# Altium schematic symbol library JL_SCH.SchLib: 1185 symbols (part 1 of 6)
Pins are listed as number, name and electrical type; pins without a type are passive.

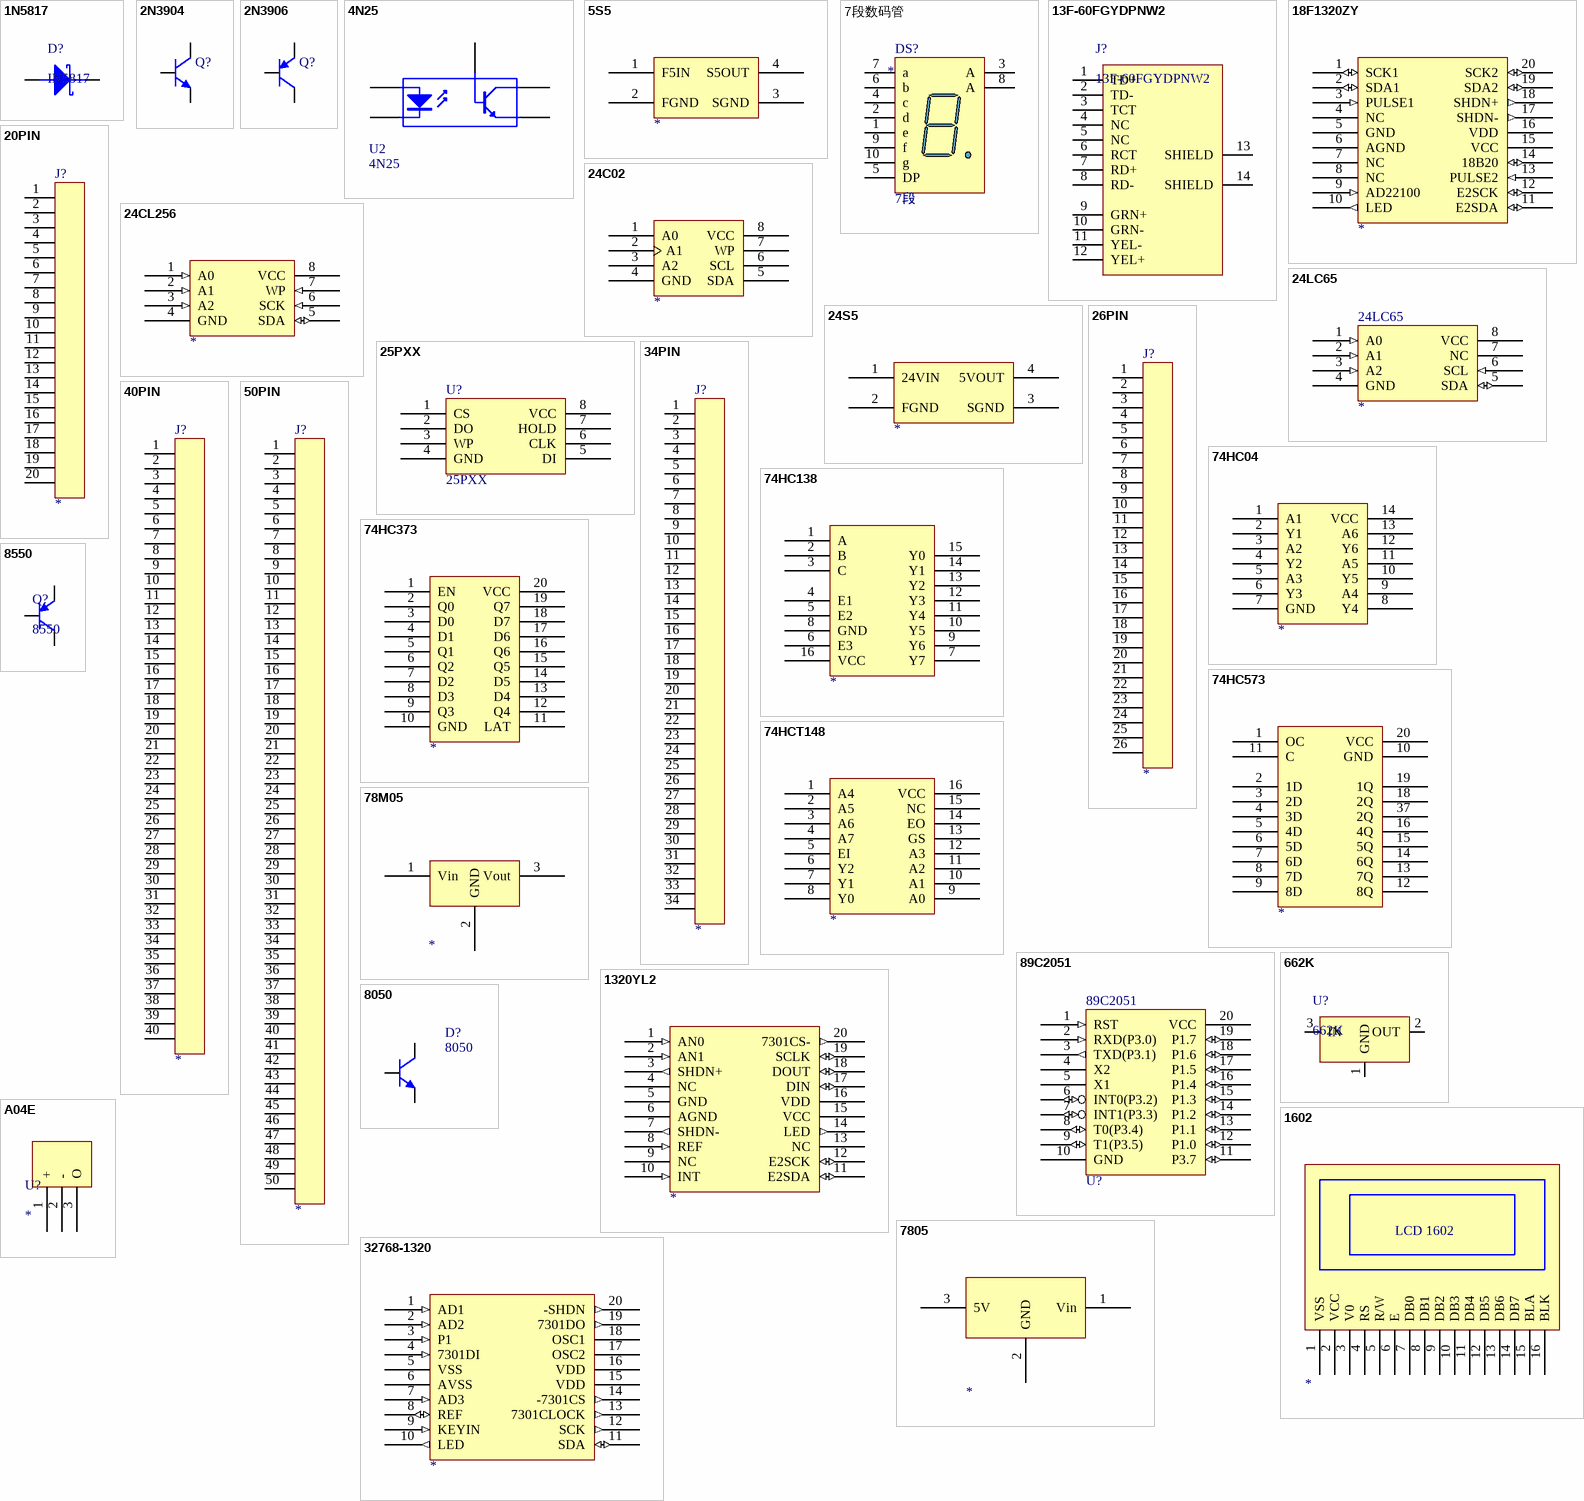
[diagram p0: symbols 1N5817 to A04E]

## 1N5817
designator D?, comment IN5817
footprint DIODE0.4
pins: 1 A, 2 K

## 2N3904
designator Q?
NPN General Purpose Amplifier; Published: 8-Jun-2000; LatestRevisionDate: 15-Jan-2003; LatestRevisionNote: PCB Footprint 'BCY-W3/D4.7' replaced; DatasheetVersion: 1997; PackageVersion: Sep-1998; PackageReference: TO-92A; Publisher: Altium Limited; Code_JEDEC: TO-92A; ComponentLink1Description: Manufacturer Link; ComponentLink1URL: http://www.fairchildsemi.com/; ComponentLink2Description: Datasheet; ComponentLink2URL: http://www.fairchildsemi.com/ds/2N%2F2N3904.pdf
footprint BCY-W3/E4 (TO, Flat Index; 3 In-Line, Axial Leads; Body Dia. 4.5mm; Leads 0.51 x 0.48 mm (max))
simulation model 2N3904 (NPN)
signal-integrity model 2N3904
pins: B 1, C 3, E 2

## 2N3906
designator Q?
PNP General Purpose Amplifier; Published: 8-Jun-2000; LatestRevisionDate: 15-Jan-2003; LatestRevisionNote: PCB Footprint 'BCY-W3/D4.7' replaced; DatasheetVersion: 1997; PackageVersion: Sep-1998; PackageReference: TO-92A; Publisher: Altium Limited; Code_JEDEC: TO-92A; ComponentLink1Description: Manufacturer Link; ComponentLink1URL: http://www.fairchildsemi.com/; ComponentLink2Description: Datasheet; ComponentLink2URL: http://www.fairchildsemi.com/ds/2N%2F2N3906.pdf
footprint BCY-W3/E4 (TO, Flat Index; 3 In-Line, Axial Leads; Body Dia. 4.5mm; Leads 0.51 x 0.48 mm (max))
simulation model 2N3906 (PNP)
signal-integrity model 2N3906
footprint sot23
pins: B 1, C 3, E 2

## 4N25
designator U2
footprint DIP6 - duplicate
pins: 1 A "Anode", 2 K "Cathode", 4 E "Emitter", 5 C "Collector", 6 B "Base"

## 5S5
designator ?
pins: 1 F5IN (power), 2 FGND (power), 3 SGND (power), 4 S5OUT (power)

## 7段数码管
designator DS?
14.2 mm General Purpose Blue 7-Segment Display: CA, RH DP, Gray Surface; MinimumIntensity: 2020 ucd; Note: IF = 10 mA; Published: 8-Jun-2000; LatestRevisionDate: 17-Dec-2003; LatestRevisionNote: Schematic revised, PCB Footprint replaced.; DatasheetVersion: 24-Sep-2002; PackageVersion: 24-Sep-2002; PackageReference: H; Publisher: Altium Limited; Colour: Blue; ComponentLink1Description: Manufacturer Link; ComponentLink1URL: http://www.agilent.com/
footprint LED-DIP10
pins: 1 e "Cathode", 2 d "Cathode", 3 A "Common Anode", 4 c "Cathode", 5 DP "Cathode", 6 b "Cathode", 7 a "Cathode", 8 A "Common Anode", 9 f "Cathode", 10 g "Cathode"
text: 7段

## 13F-60FGYDPNW2
designator J?
footprint RJ45
pins: 1 TD+, 2 TD-, 3 TCT, 4 NC, 5 NC, 6 RCT, 7 RD+, 8 RD-, 9 GRN+, 10 GRN-, 11 YEL-, 12 YEL+, 13 SHIELD, 14 SHIELD

## 18F1320ZY
designator ?
pins: 1 SCK1 (io), 2 SDA1 (io), 3 PULSE1 (in), 4 NC, 5 GND (power), 6 AGND (power), 7 NC, 8 NC, 9 AD22100 (in), 10 LED (out), 11 E2SDA (io), 12 E2SCK (io), 13 PULSE2 (in), 14 18B20 (io), 15 VCC (power), 16 VDD (power), 17 SHDN- (out), 18 SHDN+ (out), 19 SDA2 (io), 20 SCK2 (io)

## 20PIN
designator J?
footprint IDC20
pins: 1, 2, 3, 4, 5, 6, 7, 8, 9, 10, 11, 12, 13, 14, 15, 16, 17, 18, 19, 20

## 24C02
designator ?
footprint SOP-8
pins: 1 A0, 2 A1, 3 A2, 4 GND, 5 SDA, 6 SCL, 7 WP, 8 VCC

## 24CL256
designator ?
pins: 1 A0 (in), 2 A1 (in), 3 A2 (in), 4 GND (power), 5 SDA (io), 6 SCK (in), 7 WP (in), 8 VCC (power)

## 24LC65
designator 24LC65
24LC65
pins: 1 A0 (in), 2 A1 (in), 3 A2 (in), 4 GND (power), 5 SDA (io), 6 SCL (in), 7 NC, 8 VCC (power)

## 24S5
designator ?
pins: 1 24VIN (power), 2 FGND (power), 3 SGND (power), 4 5VOUT (power)

## 25PXX
designator U?
footprint SOJ-8
pins: 1 CS, 2 DO, 3 WP, 4 GND, 5 DI, 6 CLK, 7 HOLD, 8 VCC

## 26PIN
designator J?
footprint IDC26
pins: 1, 2, 3, 4, 5, 6, 7, 8, 9, 10, 11, 12, 13, 14, 15, 16, 17, 18, 19, 20, 21, 22, 23, 24, 25, 26

## 34PIN
designator J?
footprint IDC34
pins: 1, 2, 3, 4, 5, 6, 7, 8, 9, 10, 11, 12, 13, 14, 15, 16, 17, 18, 19, 20, 21, 22, 23, 24, 25, 26, 27, 28, 29, 30, 31, 32, 33, 34

## 40PIN
designator J?
footprint IDC40
pins: 1, 2, 3, 4, 5, 6, 7, 8, 9, 10, 11, 12, 13, 14, 15, 16, 17, 18, 19, 20, 21, 22, 23, 24, 25, 26, 27, 28, 29, 30, 31, 32, 33, 34, 35, 36, 37, 38, 39, 40

## 50PIN
designator J?
footprint IDC50
pins: 1, 2, 3, 4, 5, 6, 7, 8, 9, 10, 11, 12, 13, 14, 15, 16, 17, 18, 19, 20, 21, 22, 23, 24, 25, 26, 27, 28, 29, 30, 31, 32, 33, 34, 35, 36, 37, 38, 39, 40, 41, 42, 43, 44, 45, 46, 47, 48, 49, 50

## 74HC04
designator ?
pins: 1 A1, 2 Y1, 3 A2, 4 Y2, 5 A3, 6 Y3, 7 GND, 8 Y4, 9 A4, 10 Y5, 11 A5, 12 Y6, 13 A6, 14 VCC

## 74HC138
designator ?
pins: 1 A, 2 B, 3 C, 4 E1, 5 E2, 6 E3, 7 Y7, 8 GND, 9 Y6, 10 Y5, 11 Y4, 12 Y3, 13 Y2, 14 Y1, 15 Y0, 16 VCC

## 74HC373
designator ?
pins: 1 EN, 2 Q0, 3 D0, 4 D1, 5 Q1, 6 Q2, 7 D2, 8 D3, 9 Q3, 10 GND, 11 LAT, 12 Q4, 13 D4, 14 D5, 15 Q5, 16 Q6, 17 D6, 18 D7, 19 Q7, 20 VCC

## 74HC573
designator ?
pins: 1 OC, 2 1D, 3 2D, 4 3D, 5 4D, 6 5D, 7 6D, 8 7D, 9 8D, 10 GND, 11 C, 12 8Q, 13 7Q, 14 6Q, 15 5Q, 16 4Q, 18 2Q, 19 1Q, 20 VCC, 37 2Q

## 74HCT148
designator ?
pins: 1 A4, 2 A5, 3 A6, 4 A7, 5 EI, 6 Y2, 7 Y1, 8 Y0, 9 A0, 10 A1, 11 A2, 12 A3, 13 GS, 14 EO, 15 NC, 16 VCC

## 78M05
designator ?
pins: 1 Vin, 2 GND, 3 Vout

## 89C2051
designator 89C2051, comment U?
89C2051
footprint SOL-20_L (20-Pin Small Outline Integrated Circuit 1.27 mm Pitch, IPC High Density)
pins: 1 RST (in), 2 RXD(P3.0) (in), 3 TXD(P3.1) (out), 4 X2, 5 X1, 6 INT0(P3.2) (io), 7 INT1(P3.3) (io), 8 T0(P3.4) (io), 9 T1(P3.5) (io), 10 GND (power), 11 P3.7 (io), 12 P1.0 (io), 13 P1.1 (io), 14 P1.2 (io), 15 P1.3 (io), 16 P1.4 (io), 17 P1.5 (io), 18 P1.6 (io), 19 P1.7 (io), 20 VCC (power)

## 662K
designator U?
footprint SOT-23
pins: 1 GND, 2 OUT, 3 IN

## 1320YL2
designator ?
pins: 1 AN0 (in), 2 AN1 (in), 3 SHDN+ (out), 4 NC, 5 GND (power), 6 AGND (power), 7 SHDN- (out), 8 REF (in), 9 NC, 10 INT (in), 11 E2SDA (io), 12 E2SCK (io), 13 NC, 14 LED (out), 15 VCC (power), 16 VDD (power), 17 DIN (io), 18 DOUT (io), 19 SCLK (io), 20 7301CS- (out)

## 1602
designator ?
pins: 1 VSS, 2 VCC, 3 V0, 4 RS, 5 R/W, 6 E, 7 DB0, 8 DB1, 9 DB2, 10 DB3, 11 DB4, 12 DB5, 13 DB6, 14 DB7, 15 BLA, 16 BLK
text: LCD 1602

## 7805
designator ?
pins: 1 Vin, 2 GND, 3 5V

## 8050
designator D?
footprint SOT23
pins: B, C, E

## 8550
designator Q?
footprint SOT23
pins: B, C, E

## 32768-1320
designator ?
pins: 1 AD1 (in), 2 AD2 (in), 3 P1 (in), 4 7301DI (in), 5 VSS (power), 6 AVSS (power), 7 AD3 (in), 8 REF (io), 9 KEYIN (in), 10 LED (out), 11 SDA (io), 12 SCK (out), 13 7301CLOCK (out), 14 -7301CS (out), 15 VDD (power), 16 VDD (power), 17 OSC2 (hiz), 18 OSC1 (hiz), 19 7301DO (out), 20 -SHDN (out)

## A04E
designator U?
Name: A04E
footprint A04E
pins: 1 +, 2 -, 3 O

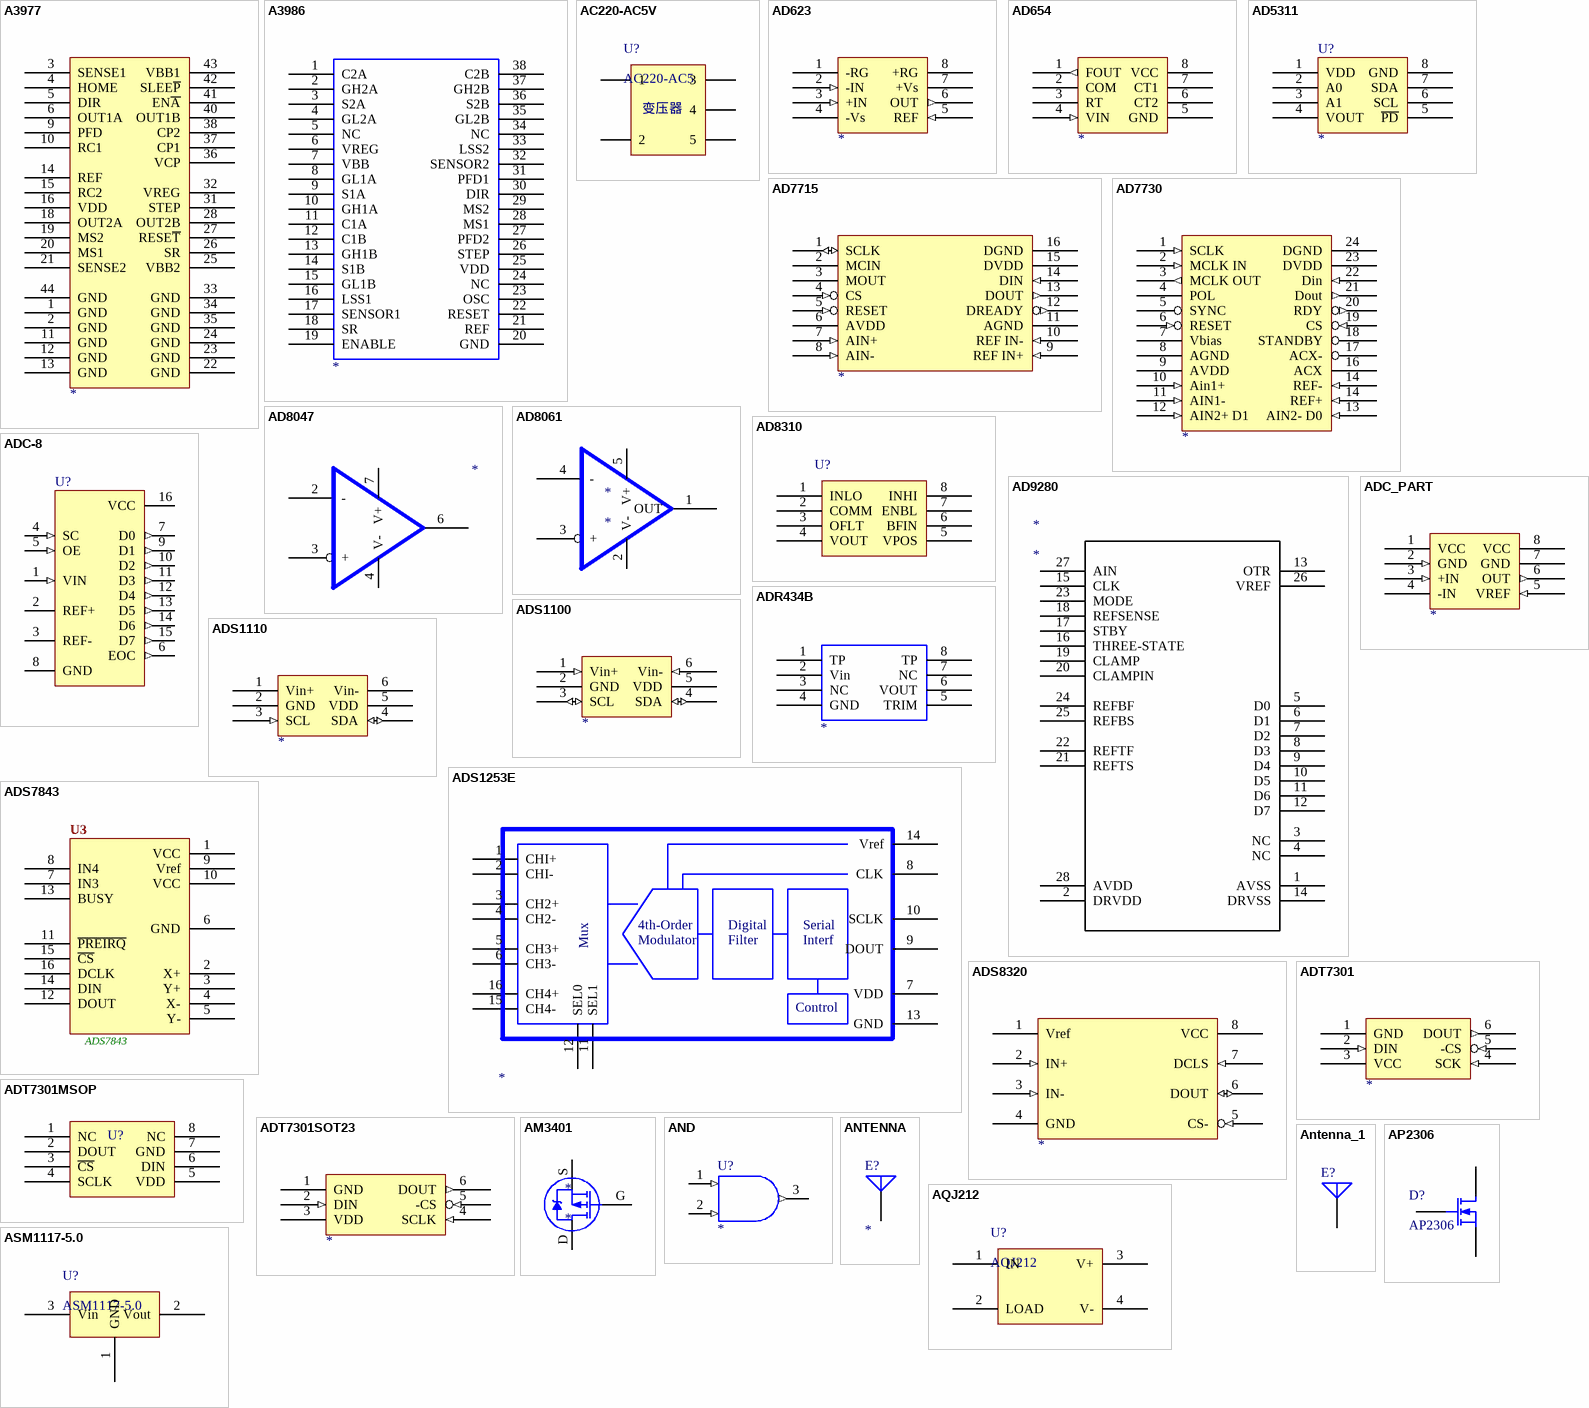
[diagram p1: symbols A3977 to ASM1117-5.0]

## A3977
designator ?
pins: 1 GND, 2 GND, 3 SENSE1, 4 HOME, 5 DIR, 6 OUT1A, 9 PFD, 10 RC1, 11 GND, 12 GND, 13 GND, 14 REF, 15 RC2, 16 VDD, 18 OUT2A, 19 MS2, 20 MS1, 21 SENSE2, 22 GND, 23 GND, 24 GND, 25 VBB2, 26 SR, 27 RESE~{T}, 28 OUT2B, 31 STEP, 32 VREG, 33 GND, 34 GND, 35 GND, 36 VCP, 37 CP1, 38 CP2, 40 OUT1B, 41 EN~{A}, 42 SLEE~{P}, 43 VBB1, 44 GND

## A3986
designator ?
pins: 1 C2A, 2 GH2A, 3 S2A, 4 GL2A, 5 NC, 6 VREG, 7 VBB, 8 GL1A, 9 S1A, 10 GH1A, 11 C1A, 12 C1B, 13 GH1B, 14 S1B, 15 GL1B, 16 LSS1, 17 SENSOR1, 18 SR, 19 ENABLE, 20 GND, 21 REF, 22 RESET, 23 OSC, 24 NC, 25 VDD, 26 STEP, 27 PFD2, 28 MS1, 29 MS2, 30 DIR, 31 PFD1, 32 SENSOR2, 33 LSS2, 34 NC, 35 GL2B, 36 S2B, 37 GH2B, 38 C2B

## AC220-AC5V
designator U?, comment AC220-AC5
footprint BYQ (Footprint not found)
pins: 1, 2, 3, 4, 5
text: 变压器

## AD623
designator ?
pins: 1 -RG, 2 -IN (in), 3 +IN (in), 4 -Vs (power), 5 REF (in), 6 OUT (out), 7 +Vs (power), 8 +RG

## AD654
designator ?
pins: 1 FOUT (out), 2 COM (power), 3 RT, 4 VIN (in), 5 GND (power), 6 CT2, 7 CT1, 8 VCC (power)

## AD5311
designator U?
footprint MSOP-8
pins: 1 VDD, 2 A0, 3 A1, 4 VOUT, 5 ~{PD}, 6 SCL, 7 SDA, 8 GND

## AD7715
designator ?
pins: 1 SCLK (io), 2 MCIN (hiz), 3 MOUT (hiz), 4 CS (in), 5 RESET (in), 6 AVDD (power), 7 AIN+ (in), 8 AIN- (in), 9 REF IN+ (in), 10 REF IN- (in), 11 AGND (power), 12 DREADY (out), 13 DOUT (out), 14 DIN (in), 15 DVDD (power), 16 DGND (power)

## AD7730
designator ?
pins: 1 SCLK (in), 2 MCLK IN (in), 3 MCLK OUT (out), 4 POL, 5 SYNC, 6 RESET (in), 7 Vbias, 8 AGND (power), 9 AVDD (power), 10 Ain1+ (in), 11 AIN1- (in), 12 AIN2+ D1 (in), 13 AIN2- D0 (in), 14 REF+ (in), 14 REF- (in), 16 ACX, 17 ACX-, 18 STANDBY, 19 CS (in), 20 RDY (out), 21 Dout (out), 22 Din (in), 23 DVDD (power), 24 DGND (power)

## AD8047
designator ?
pins: 2 -, 3 +, 4 V-, 6, 7 V+

## AD8061
designator *
footprint SOT23-5
pins: 1 OUT, 2 V-, 3 +, 4 -, 5 V+

## AD8310
designator U?  (value not drawn)
footprint MSOP-8
pins: 1 INLO, 2 COMM, 3 OFLT, 4 VOUT, 5 VPOS, 6 BFIN, 7 ENBL, 8 INHI

## AD9280
designator *
footprint RS-28 (Footprint not found)
pins: 1 AVSS, 2 DRVDD (power), 3 NC, 4 NC, 5 D0, 6 D1, 7 D2, 8 D3, 9 D4, 10 D5, 11 D6, 12 D7, 13 OTR, 14 DRVSS, 15 CLK, 16 THREE-STATE, 17 STBY, 18 REFSENSE, 19 CLAMP, 20 CLAMPIN, 21 REFTS, 22 REFTF, 23 MODE, 24 REFBF, 25 REFBS, 26 VREF, 27 AIN, 28 AVDD (power)

## ADC-8
designator U?
Generic 8-Bit A/D Converter; Published: 8-Jun-2000; LatestRevisionDate: 29-May-2009; LatestRevisionNote: IPC-7351 Footprint Added.; PackageVersion: Mar-2002; PackageReference: SOT403-1; Publisher: Altium Limited; PackageDescription: 16-Pin Thin Small Outline Package 0.65 mm Pitch; Code_JEDEC: MO-153
footprint TSOP65P640-16AN (TSOP, 16-Leads, Body 5x4.4mm, Pitch 0.65mm, IPC Medium Density)
footprint TSOP65P640-16AL (TSOP, 16-Leads, Body 5x4.4mm, Pitch 0.65mm, IPC High Density)
footprint TSOP65P640-16AM (TSOP, 16-Leads, Body 5x4.4mm, Pitch 0.65mm, IPC Low Density)
simulation model ADC8 (SIMCODE)
pins: 1 VIN (in), 2 REF+, 3 REF-, 4 SC (in), 5 OE (in), 6 EOC (out), 7 D0 (out), 8 GND (power), 9 D1 (out), 10 D2 (out), 11 D3 (out), 12 D4 (out), 13 D5 (out), 14 D6 (out), 15 D7 (out), 16 VCC (power)

## ADC_PART
designator ?
pins: 1 VCC, 2 GND (in), 3 +IN (in), 4 -IN (power), 5 VREF (in), 6 OUT (out), 7 GND (power), 8 VCC

## ADR434B
designator ?
pins: 1 TP, 2 Vin, 3 NC, 4 GND, 5 TRIM, 6 VOUT, 7 NC, 8 TP

## ADS1100
designator ?
pins: 1 Vin+ (in), 2 GND (power), 3 SCL (io), 4 SDA (io), 5 VDD (power), 6 Vin- (in)

## ADS1110
designator ?
pins: 1 Vin+, 2 GND (power), 3 SCL (in), 4 SDA (io), 5 VDD (power), 6 Vin-

## ADS1253E
designator ?
pins: 1 CHI+, 2 CHI-, 3 CH2+, 4 CH2-, 5 CH3+, 6 CH3-, 7 VDD, 8 CLK, 9 DOUT, 10 SCLK, 11 SEL1, 12 SEL0, 13 GND, 14 Vref, 15 CH4-, 16 CH4+
text: 4th-Order; Digital; Serial; Mux; Modulator; Filter; Interf; Control

## ADS7843
designator U3
footprint SSOP-16
pins: 1 VCC, 2 X+, 3 Y+, 4 X-, 5 Y-, 6 GND, 7 IN3, 8 IN4, 9 Vref, 10 VCC, 11 ~{PREIRQ}, 12 DOUT, 13 BUSY, 14 DIN, 15 ~{CS}, 16 DCLK

## ADS8320
designator ?
pins: 1 Vref, 2 IN+ (in), 3 IN- (in), 4 GND (power), 5 CS- (in), 6 DOUT (io), 7 DCLS (in), 8 VCC (power)

## ADT7301
designator ?
pins: 1 GND (power), 2 DIN (in), 3 VCC (power), 4 SCK (in), 5 -CS (in), 6 DOUT (out)

## ADT7301MSOP
designator U?, comment ADT7301  (value not drawn)
Name: ADT7301
footprint MSOP-8
pins: 1 NC (power), 2 DOUT, 3 ~{CS} (power), 4 SCLK, 5 VDD, 6 DIN, 7 GND (power), 8 NC

## ADT7301SOT23
designator ?
pins: 1 GND (power), 2 DIN (in), 3 VDD (power), 4 SCLK (in), 5 -CS (in), 6 DOUT (out)

## AM3401
designator *
pins: D, G, S

## AND
designator U?
AND Gate
pins: 1 A (in), 2 B (in), 3 Y (out)

## ANTENNA
designator E?
Generic Antenna
pins: 1 A

## Antenna_1
designator E?
Generic Antenna; Published: 24-Mar-1999; LatestRevisionDate: 17-Jul-2002; LatestRevisionNote: Re-released for DXP Platform.; PackageReference: PIN1; Publisher: Altium Limited
footprint PIN1 (Generic Antenna; 1 Lead)
pins: 1 A

## AP2306
designator D?
footprint SOT-23
pins: 1 G, 2 S, 3 D

## AQJ212
designator U?
pins: 1 IN, 2 LOAD, 3 V+, 4 V-

## ASM1117-5.0
designator U?
footprint SOT-223
pins: 1 GND, 2 Vout, 3 Vin

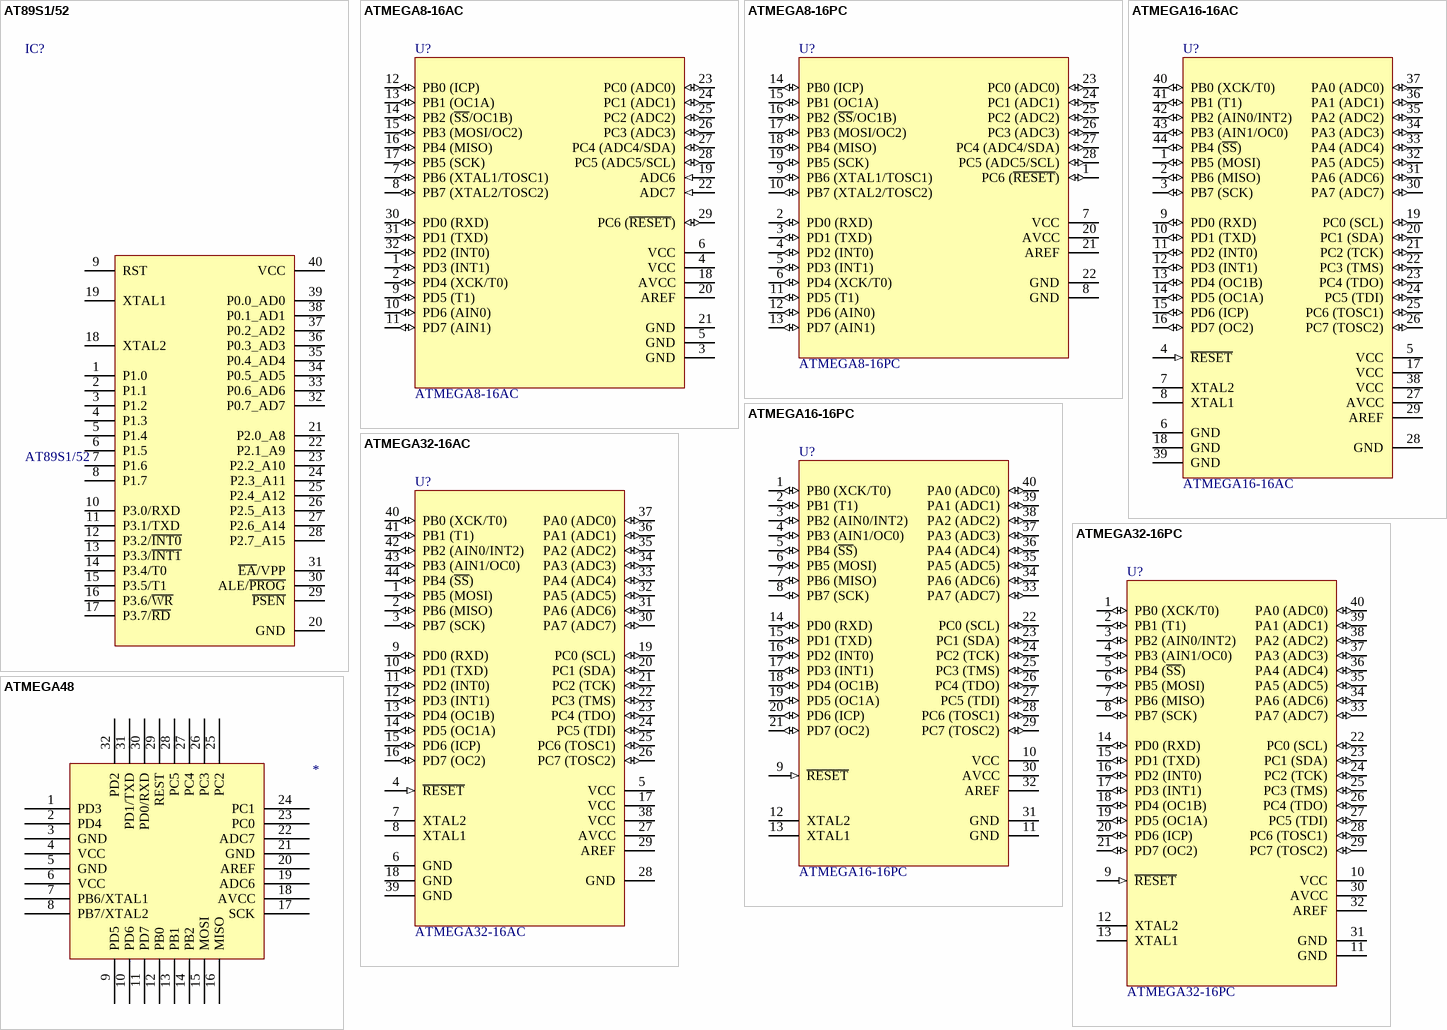
[diagram p2: symbols AT89S1/52 to ATMEGA48]

## AT89S1/52
designator IC?
8051/52单片机
footprint DIP40
footprint ZIF40
pins: 1 P1.0, 2 P1.1, 3 P1.2, 4 P1.3, 5 P1.4, 6 P1.5, 7 P1.6, 8 P1.7, 9 RST, 10 P3.0/RXD, 11 P3.1/TXD, 12 P3.2/~{INT0}, 13 P3.3/~{INT1}, 14 P3.4/T0, 15 P3.5/T1, 16 P3.6/~{WR}, 17 P3.7/~{RD}, 18 XTAL2, 19 XTAL1, 20 GND, 21 P2.0_A8, 22 P2.1_A9, 23 P2.2_A10, 24 P2.3_A11, 25 P2.4_A12, 26 P2.5_A13, 27 P2.6_A14, 28 P2.7_A15, 29 ~{PSEN}, 30 ALE/~{PROG}, 31 ~{EA}/VPP, 32 P0.7_AD7, 33 P0.6_AD6, 34 P0.5_AD5, 35 P0.4_AD4, 36 P0.3_AD3, 37 P0.2_AD2, 38 P0.1_AD1, 39 P0.0_AD0, 40 VCC